# Altium footprint library ATROTECH.PcbLib: 334 footprints (part 20 of 21)
Each footprint in its own frame and in the unit in brackets; x right, y up, seen from the top. Pads: shape width x height; smd on the part's side, far side on the other; paste and mask are expansions set on the pad; w line width, h text height; cw(c..) or ccw(c..) is an arc to the next point about the centre after c.
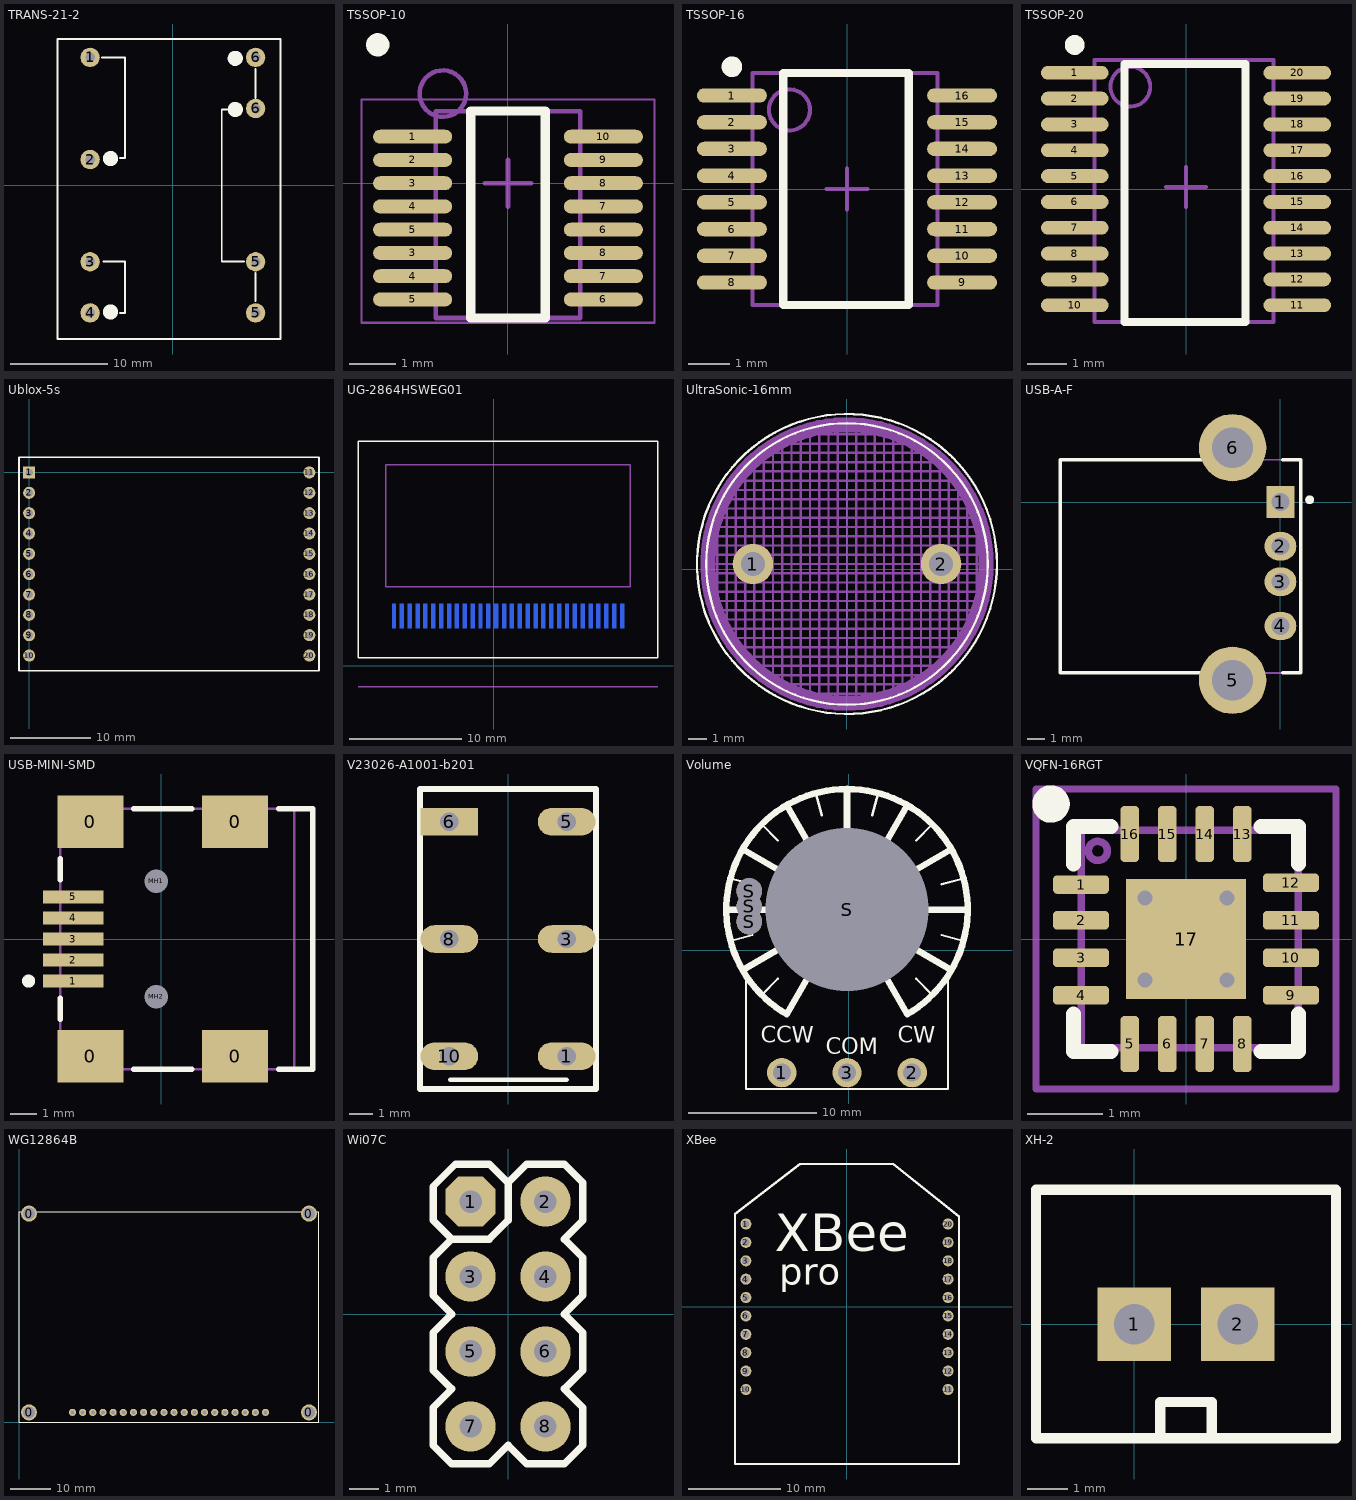
[diagram p19: the footprints below, top view; thin cyan lines are the x and y axes]

## TRANS-21-2 [mm]
pads (8):
  round 2 hole 1: 1(-8.55,13.2) 2(-8.55,2.64) 3(-8.55,-7.92) 4(-8.55,-13.2) 5(8.55,-13.2) 5(8.55,-7.92) 6(8.55,7.92) 6(8.55,13.2)
Top Overlay:
  circle w1: c6.45,7.82 r0.283
  circle w1: c6.45,13.1 r0.283
  circle w1: c-6.45,-13.1 r0.283
  circle w1: c-6.45,2.74 r0.283
  lines w0.2: -7.35,13.2 -4.95,13.2 -4.95,2.8 -5.45,2.8 ; -7.15,-7.9 -4.95,-7.9 -4.95,-13.2 -5.45,-13.2 ; 5.55,7.8 5.05,7.8 5.05,-7.9 7.35,-7.9 ; 8.55,-12 8.55,-9.1 ; 8.55,9 8.55,12 ; -11.9,-15.9 -11.9,15.1 11.1,15.1 11.1,-15.9 -11.9,-15.9

## TSSOP-10 [mm]
pads (16):
  oval 1.7x0.3 smd: 1(-2.05,1) 2(-2.05,0.5) 3(-2.05,-1.5) 3(-2.05,0) 4(-2.05,-2) 4(-2.05,-0.5) 5(-2.05,-2.5) 5(-2.05,-1) 6(2.05,-2.5) 6(2.05,-1) 7(2.05,-2) 7(2.05,-0.5) 8(2.05,-1.5) 8(2.05,0) 9(2.05,0.5) 10(2.05,1)
Top Overlay:
  circle w0.25: c-2.8,2.975 r0.125
  lines w0.2: -0.8,-2.9 -0.8,1.55 0.8,1.55 0.8,-2.9 -0.8,-2.9
Mechanical 13:
  circle w0.1: c-1.4,1.925 r0.5
  lines w0.1: -1.55,-2.9 -1.55,1.55 1.55,1.55 1.55,-2.9 -1.55,-2.9
Mechanical 15:
  lines w0.05: -3.15,-3 3.15,-3 3.15,1.8 -3.15,1.8 -3.15,-3
  lines w0.1: -0.5,0 0.5,0 ; 0,-0.5 0,0.5

## TSSOP-16 [mm]
pads (16):
  oval 1.7x0.35 smd: 1(-2.8,2.275) 2(-2.8,1.625) 3(-2.8,0.975) 4(-2.8,0.325) 5(-2.8,-0.325) 6(-2.8,-0.975) 7(-2.8,-1.625) 8(-2.8,-2.275) 9(2.8,-2.275) 10(2.8,-1.625) 11(2.8,-0.975) 12(2.8,-0.325) 13(2.8,0.325) 14(2.8,0.975) 15(2.8,1.625) 16(2.8,2.275)
Top Overlay:
  circle w0.25: c-2.8,2.975 r0.125
  lines w0.2: -1.55,-2.825 1.5,-2.825 1.5,2.825 -1.55,2.825 -1.55,-2.825
Mechanical 13:
  circle w0.1: c-1.4,1.925 r0.5
  lines w0.1: -2.3,-2.825 2.2,-2.825 2.2,2.825 -2.3,2.825 -2.3,-2.825
Mechanical 15:
  lines w0.1: -0.5,0 0.5,0 ; 0,-0.5 0,0.5
3D body "User Library-TSSOP-16-1.step": height 1.1, standoff 0, extent -3.2,-2.5 3.2,2.5

## TSSOP-20 [mm]
pads (20):
  oval 1.7x0.35 smd: 1(-2.8,2.925) 2(-2.8,2.275) 3(-2.8,1.625) 4(-2.8,0.975) 5(-2.8,0.325) 6(-2.8,-0.325) 7(-2.8,-0.975) 8(-2.8,-1.625) 9(-2.8,-2.275) 10(-2.8,-2.925) 11(2.8,-2.925) 12(2.8,-2.275) 13(2.8,-1.625) 14(2.8,-0.975) 15(2.8,-0.325) 16(2.8,0.325) 17(2.8,0.975) 18(2.8,1.625) 19(2.8,2.275) 20(2.8,2.925)
Top Overlay:
  circle w0.25: c-2.8,3.625 r0.125
  lines w0.2: -1.55,-3.35 -1.55,3.15 1.5,3.15 1.5,-3.35 -1.55,-3.35
Mechanical 13:
  circle w0.1: c-1.4,2.575 r0.5
  lines w0.1: -2.3,-3.35 -2.3,3.25 2.2,3.25 2.2,-3.35 -2.3,-3.35
Mechanical 15:
  lines w0.1: -0.5,0.05 0.5,0.05 ; 0,-0.45 0,0.55
3D body "User Library-TSSOP20.step": height 1.09, standoff 0, extent -3.14,-3.35 3.14,3.15

## Ublox-5s [mm] "Ublox-5s GPS Module"
pads (20):
  rect 1.5x1.5 hole 0.9: 1(0,0)
  round 1.5 hole 0.9: 2(0,-2.54) 3(0,-5.08) 4(0,-7.62) 5(0,-10.16) 6(0,-12.7) 7(0,-15.24) 8(0,-17.78) 9(0,-20.32) 10(0,-22.86) 11(35,0) 12(35,-2.54) 13(35,-5.08) 14(35,-7.62) 15(35,-10.16) 16(35,-12.7) 17(35,-15.24) 18(35,-17.78) 19(35,-20.32) 20(35,-22.86)
Top Overlay:
  lines w0.2: -1.27,-24.765 -1.27,1.905 36.195,1.905 36.195,-0.635 36.195,-24.765 -1.27,-24.765

## UG-2864HSWEG01 [mm] "0.96INCH OLED 128x64"
pads (30):
  rect 0.35x2.2 smd far side: 1(-8.878,4.437) 2(-8.178,4.437) 3(-7.478,4.437) 4(-6.778,4.437) 5(-6.078,4.437) 6(-5.378,4.437) 7(-4.678,4.437) 8(-3.978,4.437) 9(-3.278,4.437) 10(-2.578,4.437) 11(-1.878,4.437) 12(-1.178,4.437) 13(-0.478,4.437) 14(0.222,4.437) 15(0.922,4.437) 16(1.622,4.437) 17(2.322,4.437) 18(3.022,4.437) 19(3.722,4.437) 20(4.422,4.437) 21(5.122,4.437) 22(5.822,4.437) 23(6.522,4.437) 24(7.222,4.437) 25(7.922,4.437) 26(8.622,4.437) 27(9.322,4.437) 28(10.022,4.437) 29(10.722,4.437) 30(11.422,4.437)
Top Overlay:
  lines w0.127: -12.081,19.997 14.622,19.997 14.622,0.737 -12.078,0.737 -12.081,19.997
Mechanical 16:
  lines w0.127: -12.078,-1.863 14.622,-1.863 ; -9.6,7.033 12.144,7.033 12.144,17.897 -9.6,17.897 -9.6,7.033
  text "PCB EDGE (1.6mm)" at -3.928,-1.363 h1.26
Mechanical 30:
  text "1" at -8.678,6.149 h0.69
  text "10" at -2.378,6.049 h0.69
  text "20" at 4.572,6.049 h0.69
  text "30" at 11.722,6.049 h0.69
3D body "User Library-096OLED.step": height 2.02, standoff -1.82, extent -12.05,-2.216 14.65,20

## UltraSonic-16mm [mil]
pads (2):
  round 86 hole 51.18: 1(-198.94,11.06) 2(201.06,11.06)
Top Overlay:
  circle w5: c1.06,11.06 r318.9
  circle w5: c1.06,11.06 r299.32
Mechanical 1:
  circle w32: c1.06,11.06 r295.93
  lines w5: -294.22,-8.63 296.34,-8.63 ; -294.22,11.06 296.34,11.06 ; -294.22,30.75 296.34,30.75 ; -294.22,50.43 296.34,50.43 ; -274.53,-87.37 276.65,-87.37 276.65,109.49 -274.53,109.49 -274.53,-107.05 276.65,-107.05 ; -274.53,-67.68 276.65,-67.68 ; -274.53,-48 276.65,-48 ; -274.53,-28.31 276.65,-28.31 ; -274.53,70.12 276.65,70.12 ; -274.53,89.8 276.65,89.8 ; -254.85,-126.74 256.97,-126.74 256.97,148.86 -254.85,148.86 -254.85,-146.42 256.97,-146.42 ; -254.85,129.17 256.97,129.17 ; -235.16,168.54 237.28,168.54 ; -38.31,306.34 -38.31,-284.22 -18.63,-284.22 ; 40.43,-284.22 40.43,-264.53 ; 40.43,306.34 40.43,286.65 ; -156.42,-225.16 158.54,-225.16 ; -156.42,-225.16 -176.11,-225.16 -176.11,247.28 -156.42,247.28 ; -156.42,-225.16 -156.42,247.28 ; -156.42,247.28 158.54,247.28 ; -117.05,-244.85 -136.74,-244.85 -136.74,266.97 -117.05,266.97 ; -117.05,-244.85 119.17,-244.85 ; -117.05,-244.85 -117.05,266.97 ; -117.05,266.97 99.49,266.97 ; -77.68,-264.53 -97.37,-264.53 -97.37,286.65 -77.68,286.65 ; -77.68,-264.53 -58,-264.53 ; -77.68,-264.53 -77.68,286.65 ; -77.68,286.65 -58,286.65 ; -58,-264.53 40.43,-264.53 ; -58,-264.53 -58,286.65 ; -58,286.65 20.75,286.65 ; -18.63,-284.22 -18.63,306.34 1.06,306.34 ; -18.63,-284.22 1.06,-284.22 ; 1.06,-284.22 20.75,-284.22 20.75,286.65 ; 1.06,-284.22 1.06,306.34 ; 1.06,306.34 20.75,306.34 20.75,286.65 ; 20.75,286.65 40.43,286.65 ; 40.43,-264.53 60.12,-264.53 ; 40.43,-264.53 40.43,286.65 ; 40.43,286.65 79.8,286.65 ; 60.12,-264.53 99.49,-264.53 ; 60.12,-264.53 60.12,286.65 79.8,286.65 ; 79.8,286.65 99.49,286.65 99.49,266.97 ; 79.8,286.65 79.8,-264.53 99.49,-264.53 ; 99.49,-264.53 99.49,-244.85 119.17,-244.85 ; 99.49,-264.53 99.49,266.97 ; 99.49,266.97 119.17,266.97 ; 119.17,-244.85 138.86,-244.85 138.86,266.97 119.17,266.97 ; 119.17,-244.85 119.17,266.97 ; 158.54,-225.16 178.23,-225.16 178.23,247.28 158.54,247.28 ; 158.54,-225.16 158.54,247.28 ; -235.16,-166.11 237.28,-166.11 237.28,188.23 -235.16,188.23 -235.16,-166.11 ; -215.48,-185.79 217.6,-185.79 217.6,207.91 -215.48,207.91 -215.48,-185.79 ; -195.79,-205.48 197.91,-205.48 197.91,227.6 -195.79,227.6 -195.79,-205.48
3D body "User Library-400PT160.step": height 472.44, standoff -393.7, extent -318.89,-318.89 318.9,318.9

## USB-A-F [mm]
pads (6):
  rect 1.6x1.8 hole 1: 1(0,0)
  oval 1.8x1.6 hole 1: 2(0,-2.5) 3(0,-4.5) 4(0,-7)
  round 3.8 hole 2.3: 5(-2.7,-10.07) 6(-2.7,3.07)
Top Overlay:
  circle w0.25: c1.651,0.127 r0.125
  lines w0.2: -4.459,-9.652 -12.439,-9.652 -12.439,2.388 -4.459,2.388 ; 0.141,-9.652 1.143,-9.652 1.143,2.388 0.141,2.388
Mechanical 13:
  lines w0.1: -12.439,-9.652 1.143,-9.652 1.143,2.388 -12.439,2.388 -12.439,-9.652
3D body "USB A.STEP": height 6.95, standoff -4.2, extent -12.573,-11.456 1.127,4.344

## USB-MINI-SMD [mm]
pads (11):
  rect 2.5x2 smd: 0(-2.7,-4.45) 0(-2.7,4.45) 0(2.8,-4.45) 0(2.8,4.45)
  rect 2.3x0.5 smd: 1(-3.35,-1.6) 2(-3.35,-0.8) 3(-3.35,0) 4(-3.35,0.8) 5(-3.35,1.6)
  round 0.6 hole 0.9 unplated: MH1(-0.2,2.2) MH2(-0.2,-2.2)
Top Overlay:
  circle w0.25: c-5.05,-1.6 r0.125
  lines w0.2: -3.85,-3.05 -3.85,-2.25 ; -3.85,2.25 -3.85,3.05 ; -1.05,-4.95 1.15,-4.95 ; -1.05,4.95 1.15,4.95 ; 4.45,-4.95 5.75,-4.95 5.75,4.95 4.45,4.95
Mechanical 1:
  lines w0.1: 5.05,-4.95 5.05,4.95
  text "PCB Edge" at 5.482,-4.036 h0.25
Mechanical 13:
  lines w0.1: -3.85,-4.95 -3.85,4.95 5.75,4.95 5.75,-4.95 -3.85,-4.95
3D body "usb_a-usb_b-m5-smd-c.STEP": height 3.93, standoff -1, extent -3.5,-5.05 5.75,4.85

## V23026-A1001-b201 [mm]
pads (6):
  oval 2.5x1.2 hole 0.8: 1(2.54,-5.08) 3(2.54,0) 5(2.54,5.08) 8(-2.54,0) 10(-2.54,-5.08)
  rect 2.5x1.2 hole 0.8: 6(-2.54,5.08)
Top Overlay:
  lines w0.2: -2.5,-6.1 2.533,-6.093
  lines w0.254: -3.81,-6.5 -3.81,6.5 3.81,6.5 3.81,-6.5 -3.81,-6.5
3D body: height -1, standoff -3, extent -2.75,-5.35 -2.25,-4.85
3D body: height -1, standoff -3, extent -2.75,-0.27 -2.25,0.23
3D body: height -1, standoff -3, extent -2.75,4.81 -2.25,5.31
3D body: height -1, standoff -3, extent 2.29,4.83 2.79,5.33
3D body: height -1, standoff -3, extent 2.33,-0.27 2.83,0.23
3D body: height -1, standoff -3, extent 2.33,-5.35 2.83,-4.85
3D body: height 6.9, standoff 0, extent -3.81,-6.5 3.81,6.5

## Volume [mil]
pads (7):
  round 90 hole 55: 1(-205,-375) 2(195,-375) 3(-5,-375)
  round 78.74 hole 78.74: S(-305,88) S(-305,135) S(-305,182)
  round 492.13 hole 500: S(-5,125)
Top Overlay:
  lines w7: -362.39,29.24 -294.78,47.35 ; -362.39,220.76 -294.78,202.65 ; -315,-75 -315,-425 305,-425 305,-75 ; -266.63,-136.63 -217.13,-87.13 ; -266.63,386.63 -217.13,337.13 ; -100.76,482.39 -82.65,414.78 ; 72.65,414.78 90.76,482.39 ; 207.13,-87.13 256.63,-136.63 ; 207.13,337.13 256.63,386.63 ; 284.78,47.35 352.39,29.24 ; 284.78,202.65 352.39,220.76
  lines w20: -375,125 -255,125 ; -325.43,-60 -221.51,0 ; -325.43,310 -221.51,250 ; -190,445.43 -130,341.51 ; -130,-91.51 -190,-195.43 cw(c-5,125) 180,-195.43 120,-91.51 ; -5,375 -5,495 ; 120,341.51 180,445.43 ; 211.51,0 315.43,-60 ; 211.51,250 315.43,310 ; 245,125 365,125
  text "COM" at -70,-318 h50
  text "CW" at 150,-283 h50
  text "CCW" at -269,-283 h50
3D body "POT.STEP": height 268.74, standoff -737.48, extent -315,-536 305,433.35
3D body "volome cover2.STEP": height 846.46, standoff 59.06, extent -277.62,-200.03 319.63,473.63

## VQFN-16RGT [mm]
pads (17):
  rrect50% 0.75x0.25 smd: 1(-1.4,0.725) 2(-1.4,0.25) 3(-1.4,-0.25) 4(-1.4,-0.75) 9(1.4,-0.75) 10(1.4,-0.25) 11(1.4,0.25) 12(1.4,0.75)
  rrect50% 0.25x0.75 smd: 5(-0.75,-1.4) 6(-0.25,-1.4) 7(0.25,-1.4) 8(0.75,-1.4) 13(0.75,1.4) 14(0.25,1.4) 15(-0.25,1.4) 16(-0.75,1.4)
  rect 1.6x1.6 smd: 17(0,0)
via -0.55,0.55 diameter 0.5 hole 0.2
via 0.55,0.55 diameter 0.5 hole 0.2
via -0.55,-0.55 diameter 0.5 hole 0.2
via 0.55,-0.55 diameter 0.5 hole 0.2
Top Overlay:
  circle w0.25: c-1.8,1.8 r0.125
  lines w0.2: -1.5,-1 -1.5,-1.5 -1,-1.5 ; -1.5,1 -1.5,1.5 -1,1.5 ; 1,-1.5 1.5,-1.5 1.5,-1 ; 1,1.5 1.5,1.5 1.5,1
Mechanical 13:
  circle w0.1: c-1.175,1.175 r0.127
  lines w0.1: -1.4,-1.45 -1.4,1.45 1.5,1.45 1.5,-1.45 -1.4,-1.45
Mechanical 15:
  lines w0.1: -0.5,0 0.5,0 ; 0,-0.5 0,0.5 ; -2,-2 -2,2 2,2 2,-2 -2,-2
3D body "User Library-QFN-16_3x3.STEP": height 0.9, standoff 0, extent -1.549,-1.521 1.493,1.521

## WG12864B [mm]
pads (24):
  round 4 hole 3: 0(2.5,52.2) 0(2.5,2.5) 0(72.5,52.2) 0(72.5,2.5)
  round 1.8 hole 1: 1(13.37,2.5) 2(15.91,2.5) 3(18.45,2.5) 4(20.99,2.5) 5(23.53,2.5) 6(26.07,2.5) 7(28.61,2.5) 8(31.15,2.5) 9(33.69,2.5) 10(36.23,2.5) 11(38.77,2.5) 12(41.31,2.5) 13(43.85,2.5) 14(46.39,2.5) 15(48.93,2.5) 16(51.47,2.5) 17(54.01,2.5) 18(56.55,2.5) 19(59.09,2.5) 20(61.63,2.5)
Top Overlay:
  lines w0.254: 0,0 0,52.7 75,52.7 75,0 0,0
3D body "wg12864.STEP": height 14.67, standoff 6.27, extent -0.1,-0.1 74.9,52.6

## Wi07C [mm] "ESP8266 MODULE"
pads (8):
  oct 1.7x1.7 hole 0.762: 1(-1.27,3.81)
  round 1.7 hole 0.762: 2(1.27,3.81) 3(-1.27,1.27) 4(1.27,1.27) 5(-1.27,-1.27) 6(1.27,-1.27) 7(-1.27,-3.81) 8(1.27,-3.81)
Top Overlay:
  lines w0.254: -1.905,2.54 -2.54,3.175 -2.54,4.318 -1.778,5.08 -0.635,5.08 0,4.445 ; -1.905,2.54 -2.54,1.905 -2.54,1.27 -2.54,0.635 -1.905,0 -2.54,-0.635 -2.54,-1.27 -2.54,-1.905 -1.905,-2.54 -2.54,-3.175 -2.54,-3.81 -2.54,-4.445 -1.905,-5.08 -0.635,-5.08 0,-4.445 0.635,-5.08 1.905,-5.08 2.54,-4.445 2.54,-3.175 1.905,-2.54 2.54,-1.905 2.54,-0.635 1.905,0 2.54,0.635 2.54,1.905 1.905,2.54 2.54,3.175 2.54,4.445 1.905,5.08 0.635,5.08 0,4.445 ; -1.905,2.54 -0.635,2.54 0,3.175 0,4.445
3D body "User Library-Wi07C.step": height 10.88, standoff -0.8, extent -2.794,-7.25 22.006,7.25

## XBee [mm]
pads (20):
  round 1.2 hole 0.8: 1(-11,9) 2(-11,7) 3(-11,5) 4(-11,3) 5(-11,1) 6(-11,-1) 7(-11,-3) 8(-11,-5) 9(-11,-7) 10(-11,-9) 11(11,-9) 12(11,-7) 13(11,-5) 14(11,-3) 15(11,-1) 16(11,1) 17(11,3) 18(11,5) 19(11,7) 20(11,9)
Top Overlay:
  lines w0.254: -12.19,-17.11 12.19,-17.11 12.19,9.3 12.19,9.813 5.05,15.53 -5.115,15.53 -12.19,10.109 -12.19,9.3 -12.19,-17.11
  text "XBee" at -7.874,4.699 h7
  text "pro" at -7.366,1.397 h5
3D body "User Library-XBP24BZ7SIT-004-radio.step": height 8.96, standoff -0.92, extent -12.192,-16.129 12.192,31.242

## XH-2 [mm]
pads (2):
  rect 1.8x1.8 hole 1: 1(0,0) 2(2.54,0)
Top Overlay:
  lines w0.254: 0.635,-2.794 0.635,-1.905 1.905,-1.905 1.905,-2.794 ; -2.413,-2.794 4.953,-2.794 4.953,3.302 -2.413,3.302 -2.413,-2.794
3D body "User Library-XH-A-1 (2).step": height 7, standoff -3.4, extent -2.43,-2.798 4.97,3.302